# Altium footprint library MyComponents_v2.5.PcbLib: 403 footprints (part 11 of 26)
Each footprint in its own frame and in the unit in brackets; x right, y up, seen from the top. Pads: shape width x height; smd on the part's side, far side on the other; paste and mask are expansions set on the pad; w line width, h text height; cw(c..) or ccw(c..) is an arc to the next point about the centre after c.
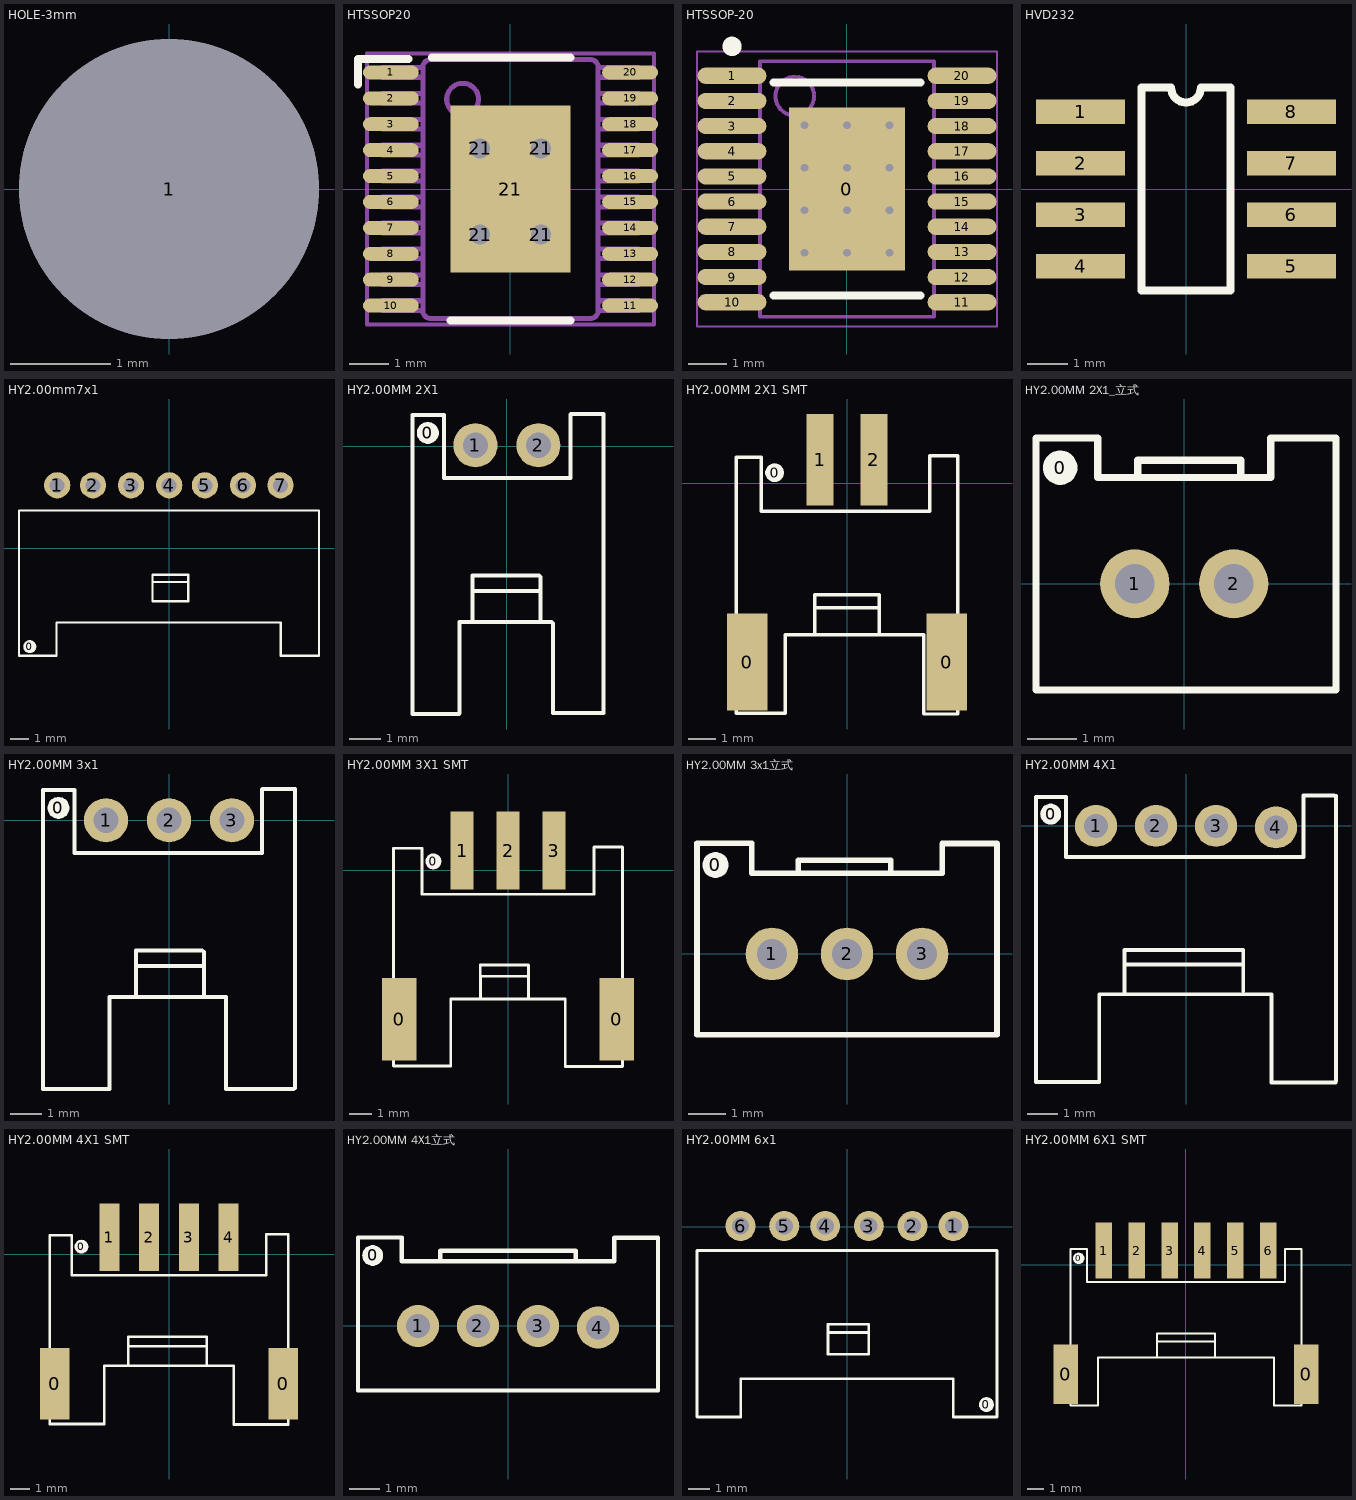
[diagram p10: the footprints below, top view; thin cyan lines are the x and y axes]

## HOLE-3mm [mm]
pads (1):
  round 3 hole 3: 1(0,0)

## HTSSOP20 [mm]
pads (25):
  oval 1.4x0.35 smd paste-0.102 mask+0.051: 1(-3,2.925) 2(-3,2.275) 3(-3,1.625) 4(-3,0.975) 5(-3,0.325) 6(-3,-0.325) 7(-3,-0.975) 8(-3,-1.625) 9(-3,-2.275) 10(-3,-2.925) 11(3,-2.925) 12(3,-2.275) 13(3,-1.625) 14(3,-0.975) 15(3,-0.325) 16(3,0.325) 17(3,0.975) 18(3,1.625) 19(3,2.275) 20(3,2.925)
  round 1 hole 0.5: 21(-0.762,-1.143) 21(-0.762,1.016) 21(0.762,-1.143) 21(0.762,1.016)
  rect 3x4.2 smd paste-0.102 mask+0.051: 21(0,0)
Top Overlay:
  lines w0.2: -3.825,2.625 -3.825,3.26 -2.555,3.26 ; -1.975,3.3 1.5,3.3 ; -1.5,-3.3 1.5,-3.3
Mechanical 13:
  drawing of 250 lines, arcs and shapes, not listed
Mechanical 15:
  lines w0.1: -0.5,0 0.5,0 ; 0,-0.5 0,0.5 ; -3.6,-3.4 3.6,-3.4 3.6,3.4 -3.6,3.4 -3.6,-3.4
3D body "HTSSOP20.stp": height 1, standoff 0, extent -3.21,-3.25 3.211,3.25

## HTSSOP-20 [mm]
height 1.1
pads (21):
  rect 3x4.21 smd: 0(0,0)
  oval 1.78x0.42 smd: 1(-2.97,2.925) 2(-2.97,2.275) 3(-2.97,1.625) 4(-2.97,0.975) 5(-2.97,0.325) 6(-2.97,-0.325) 7(-2.97,-0.975) 8(-2.97,-1.625) 9(-2.97,-2.275) 10(-2.97,-2.925) 11(2.97,-2.925) 12(2.97,-2.275) 13(2.97,-1.625) 14(2.97,-0.975) 15(2.97,-0.325) 16(2.97,0.325) 17(2.97,0.975) 18(2.97,1.625) 19(2.97,2.275) 20(2.97,2.925)
via 1.1,-1.65 diameter 0.5 hole 0.2
via 0,-1.65 diameter 0.5 hole 0.2
via -1.1,-1.65 diameter 0.5 hole 0.2
via 1.1,-0.55 diameter 0.5 hole 0.2
via 0,-0.55 diameter 0.5 hole 0.2
via -1.1,-0.55 diameter 0.5 hole 0.2
via 1.1,0.55 diameter 0.5 hole 0.2
via 0,0.55 diameter 0.5 hole 0.2
via -1.1,0.55 diameter 0.5 hole 0.2
via 1.1,1.65 diameter 0.5 hole 0.2
via 0,1.65 diameter 0.5 hole 0.2
via -1.1,1.65 diameter 0.5 hole 0.2
Top Overlay:
  circle w0.25: c-2.97,3.685 r0.125
  lines w0.2: -1.9,-2.75 1.9,-2.75 ; -1.9,2.75 1.9,2.75
Mechanical 13:
  circle w0.1: c-1.35,2.4 r0.5
  lines w0.1: -2.25,-3.3 2.25,-3.3 2.25,3.3 -2.25,3.3 -2.25,-3.3
Mechanical 15:
  lines w0.05: -3.875,-3.55 3.875,-3.55 3.875,3.55 -3.875,3.55 -3.875,-3.55
  lines w0.1: -0.5,0 0.5,0 ; 0,-0.5 0,0.5
3D body "HTSSOP20.step": height 0.95, standoff -0.06, extent -3.163,-3.251 3.251,3.249

## HVD232 [mm]
pads (8):
  rect 2.2x0.6 smd: 1(-2.6,1.905) 2(-2.6,0.635) 3(-2.6,-0.635) 4(-2.6,-1.905) 5(2.6,-1.905) 6(2.6,-0.635) 7(2.6,0.635) 8(2.6,1.905)
Top Overlay:
  lines w0.2: -1.1,-2.5 1.1,-2.5 1.1,2.5 0.367,2.5 cw(c0,2.5) -0.367,2.5 -1.1,2.5 -1.1,-2.5

## HY2.00mm7x1 [mm]
pads (8):
  round 0.7 on Top Overlay: 0(-7.425,-5.252)
  round 1.4 hole 0.8: 1(-5.962,3.352) 2(-4.057,3.352) 3(-2.025,3.352) 4(0.007,3.352) 5(1.912,3.352) 6(3.944,3.352) 7(5.944,3.352)
Top Overlay:
  lines w0.127: -0.88,-1.805 1.025,-1.805 ; 5.962,-5.742 5.962,-3.964 0.062,-3.964 -6,-3.964 -6,-5.742 -8,-5.742 -8,2.005 7.994,2.005 7.994,-3.964 7.994,-5.742 5.994,-5.742 ; -0.88,-2.821 1.025,-2.821 1.025,-1.424 -0.88,-1.424 -0.88,-2.821
3D body "HY2.0A-7P.STEP": height 5.15, standoff -2.85, extent -8.051,-4.885 7.949,3.556

## HY2.00MM 2X1 [mm] "额定电流2A，额定电压250V"
height 5.1
pads (3):
  round 0.7 on Top Overlay: 0(-2.51,0.425)
  round 1.4 hole 0.8: 1(-1,0.034) 2(1,0.034)
Top Overlay:
  lines w0.127: -2,-1.008 -2,0.992 ; -2,-1.007 2.013,-1.007 ; -2,1 -3,1 -3,-8.5 -1.525,-8.5 ; -1.5,-8.475 -1.5,-5.579 1.42,-5.579 1.472,-5.631 1.472,-5.782 1.472,-8.475 3.071,-8.475 3.071,1.025 ; -1.095,-5.554 -1.095,-4.588 ; 1.013,-4.588 -1.095,-4.588 ; 1.064,-5.477 1.064,-4.157 1.013,-4.106 -1.095,-4.106 -1.095,-4.588 ; 2.013,-0.983 2.013,1.017 ; 2.029,1.025 3.029,1.025
3D body "HY2.0A-2P.STEP": height 5.11, standoff -3.19, extent -2.949,-8.293 3.051,0.148

## HY2.00MM 2X1 SMT [mm]
pads (5):
  rect 1.5x3.6 smd: 0(-3.7,-6.635) 0(3.7,-6.635)
  round 0.7 on Top Overlay: 0(-2.685,0.391)
  rect 1x3.4 smd: 1(-1,0.865) 2(1,0.865)
Top Overlay:
  lines w0.127: -1.2,-5.613 -1.2,-4.648 ; 1.168,-4.623 -1.2,-4.623 -1.2,-4.14 1.2,-4.14 1.2,-5.613 ; 2.849,-5.664 2.849,-8.56 4.1,-8.56 ; 2.849,-5.613 -0.58,-5.613 -2.286,-5.613 -2.286,-8.534 -4.1,-8.534 -4.1,0.966 -3.175,0.966 -3.175,-1.041 3.073,-1.041 3.073,1.016 4.1,1.016 ; 4.1,-8.509 4.1,0.991
3D body "HY2.0AWR-2P.STEP": height 5.1, standoff 0, extent -3.975,-8.55 4.025,2.141

## HY2.00MM 2X1_立式 [mm] "额定电流2A，额定电压250V"
height 5.1
pads (3):
  round 0.7 on Top Overlay: 0(-2.51,2.35)
  round 1.4 hole 0.8: 1(-1,0) 2(1,0)
Top Overlay:
  lines w0.15: -0.94,2.15 -0.94,2.5 1.143,2.5 1.143,2.15 ; -3,-2.15 -3,2.95 -1.75,2.95 -1.75,2.15 1.75,2.15 1.75,2.95 3.071,2.95 3.071,-2.15 -3,-2.15
3D body "HY2_0 2P-1.step": height 8, standoff -3.19, extent -3,-2.175 3,2.925
3D body: height 1.1, standoff 0, extent -3,2.15 -3,2.15

## HY2.00MM 3x1 [mm] "额定电流2A"
height 5.1
pads (4):
  round 0.7 on Top Overlay: 0(-3.51,0.391)
  round 1.4 hole 0.8: 1(-2,0) 2(0,0) 3(2,0)
Top Overlay:
  lines w0.127: -3,-1.042 -3,0.957 ; -3,-1.041 2.96,-1.041 ; -3,0.966 -4,0.966 -4,-8.534 -1.892,-8.534 -1.892,-5.613 0.42,-5.613 1.817,-5.613 ; -1.054,-5.613 -1.054,-4.648 ; 1.055,-4.623 -1.054,-4.623 -1.054,-4.14 1.055,-4.14 1.105,-4.191 1.105,-5.512 ; 1.817,-5.639 1.817,-8.534 3.95,-8.534 ; 2.96,-1.017 2.96,0.983 ; 2.976,0.991 3.976,0.991 ; 4,-8.509 4,0.991
3D body "HY2.0A-3P.STEP": height 5.11, standoff -3.19, extent -4,-7.971 4,0.229

## HY2.00MM 3X1 SMT [mm]
pads (6):
  rect 1.5x3.6 smd: 0(-4.75,-6.5) 0(4.75,-6.5)
  round 0.7 on Top Overlay: 0(-3.26,0.391)
  rect 1x3.4 smd: 1(-2,0.865) 2(0,0.865) 3(2,0.865)
Top Overlay:
  lines w0.127: -1.206,-5.588 -1.206,-4.623 ; 0.898,-5.588 0.898,-4.14 -1.21,-4.14 -1.21,-4.623 0.898,-4.623 ; -5,-8.534 -5,0.966 -3.75,0.966 -3.75,-1.041 3.75,-1.041 3.75,1.016 5,1.016 5,-8.56 2.5,-8.56 2.5,-5.613 0.42,-5.613 -2.5,-5.613 -2.5,-8.534 -5,-8.534
3D body "HY2.0AWR-3P.STEP": height 5.1, standoff 0, extent -5.025,-8.525 4.975,2.166

## HY2.00MM 3x1立式 [mm] "额定电流2A"
height 5.1
pads (4):
  round 0.7 on Top Overlay: 0(-3.507,2.375)
  round 1.4 hole 0.8: 1(-2,0) 2(0,0) 3(2,0)
Top Overlay:
  lines w0.15: -4,2.95 -4,-2.15 4,-2.15 4,2.946 2.54,2.946 2.54,2.15 -2.54,2.15 -2.54,2.95 -3.997,2.95 ; -1.295,2.15 -1.295,2.5 1.168,2.5 1.168,2.15
3D body "HY2_0 3P.step": height 8, standoff -3.19, extent -4,-2.15 4,2.95

## HY2.00MM 4X1 [mm]
pads (5):
  round 0.7 on Top Overlay: 0(-4.51,0.391)
  round 1.4 hole 0.8: 1(-3,0) 2(-1,0) 3(1,0) 4(3,-0.051)
Top Overlay:
  lines w0.127: -4,-1.042 -4,0.957 ; -4,-1.041 3.915,-1.041 ; -4,0.966 -5,0.966 -5,-8.534 -2.892,-8.534 -2.892,-5.613 -0.58,-5.613 2.849,-5.613 ; -2.054,-5.613 -2.054,-4.648 ; 1.833,-4.623 -2.054,-4.623 -2.054,-4.14 1.909,-4.14 1.909,-5.512 ; 2.849,-5.664 2.849,-8.56 4.982,-8.56 ; 3.915,-0.992 3.915,1.008 ; 3.931,1.016 4.931,1.016 ; 5,-8.509 5,0.991
3D body "HY2.0A-4p.STEP": height 5.1, standoff -2.9, extent -5.025,-8.238 4.975,0.203

## HY2.00MM 4X1 SMT [mm]
pads (7):
  rect 1.5x3.6 smd: 0(-5.75,-6.5) 0(5.75,-6.5)
  round 0.7 on Top Overlay: 0(-4.41,0.391)
  rect 1x3.4 smd: 1(-3,0.865) 2(-1,0.865) 3(1,0.865) 4(3,0.865)
Top Overlay:
  lines w0.127: -2.054,-5.613 -2.054,-4.648 ; 1.833,-4.623 -2.054,-4.623 -2.054,-4.14 1.909,-4.14 1.909,-5.512 ; -6,-8.534 -6,0.966 -4.9,0.966 -4.9,-1.041 4.9,-1.041 4.9,1.016 6,1.016 6,-8.56 3.25,-8.56 3.25,-5.613 -0.58,-5.613 -3.25,-5.613 -3.25,-8.534 -6,-8.534
3D body "HY2.0AWR-4P.STEP": height 5.1, standoff 0, extent -6,-8.5 6,2.191

## HY2.00MM 4X1立式 [mm]
pads (5):
  round 0.7 on Top Overlay: 0(-4.51,2.35)
  round 1.4 hole 0.8: 1(-3,0) 2(-1,0) 3(1,0) 4(3,-0.051)
Top Overlay:
  lines w0.15: -2.25,2.15 -2.25,2.5 2.25,2.5 2.25,2.15 ; -5,-2.15 -5,2.95 -3.54,2.95 -3.54,2.15 3.54,2.15 3.54,2.946 5,2.946 5,-2.15 -5,-2.15
3D body "HY2_0 4P.step": height 8, standoff -3.19, extent -5,-2.15 5,2.95

## HY2.00MM 6x1 [mm]
pads (7):
  round 0.7 on Top Overlay: 0(6.479,-8.294)
  round 1.4 hole 0.8: 1(4.937,0.021) 2(3.032,0.021) 3(1,0.021) 4(-1.032,0.021) 5(-2.937,0.021) 6(-4.969,0.021)
Top Overlay:
  lines w0.127: -0.905,-4.932 1,-4.932 ; 4.937,-8.869 4.937,-7.091 -0.963,-7.091 -4.969,-7.091 -4.969,-8.869 -7.001,-8.869 -7.001,-1.134 -6.989,-1.122 6.969,-1.122 6.969,-7.091 6.969,-8.869 4.969,-8.869 ; -0.905,-5.948 1,-5.948 1,-4.551 -0.905,-4.551 -0.905,-5.948
3D body "HY2.0A-6P.STEP": height 5.04, standoff -2.97, extent -7,-8 7,0.3

## HY2.00MM 6X1 SMT [mm]
pads (9):
  rect 1.5x3.6 smd: 0(-7.3,-6.635) 0(7.3,-6.635)
  round 0.7 on Top Overlay: 0(-6.51,0.391)
  rect 1x3.4 smd: 1(-5,0.865) 2(-3,0.865) 3(-1,0.865) 4(1,0.865) 5(3,0.865) 6(5,0.865)
Top Overlay:
  lines w0.127: -6,-1.042 -6,0.957 ; -6,-1.041 0.085,-1.041 6,-1.041 ; -6,0.966 -7,0.966 -7,-8.534 -5.327,-8.534 -5.327,-5.613 -2.58,-5.613 -1,-5.613 2.58,-5.613 5.327,-5.613 5.327,-8.534 7,-8.534 7,0.966 6,0.966 ; -1.75,-5.613 -1.75,-4.648 ; -0.354,-4.648 1.754,-4.648 1.754,-4.166 -0.354,-4.166 ; 0.354,-4.648 -1.754,-4.648 -1.754,-4.166 0.354,-4.166 ; 1.75,-5.613 1.75,-4.648 ; 6,-1.042 6,0.957